# Altium footprint library ThanhNT.PcbLib: 579 footprints (part 32 of 37)
Each footprint in its own frame and in the unit in brackets; x right, y up, seen from the top. Pads: shape width x height; smd on the part's side, far side on the other; paste and mask are expansions set on the pad; w line width, h text height; cw(c..) or ccw(c..) is an arc to the next point about the centre after c.
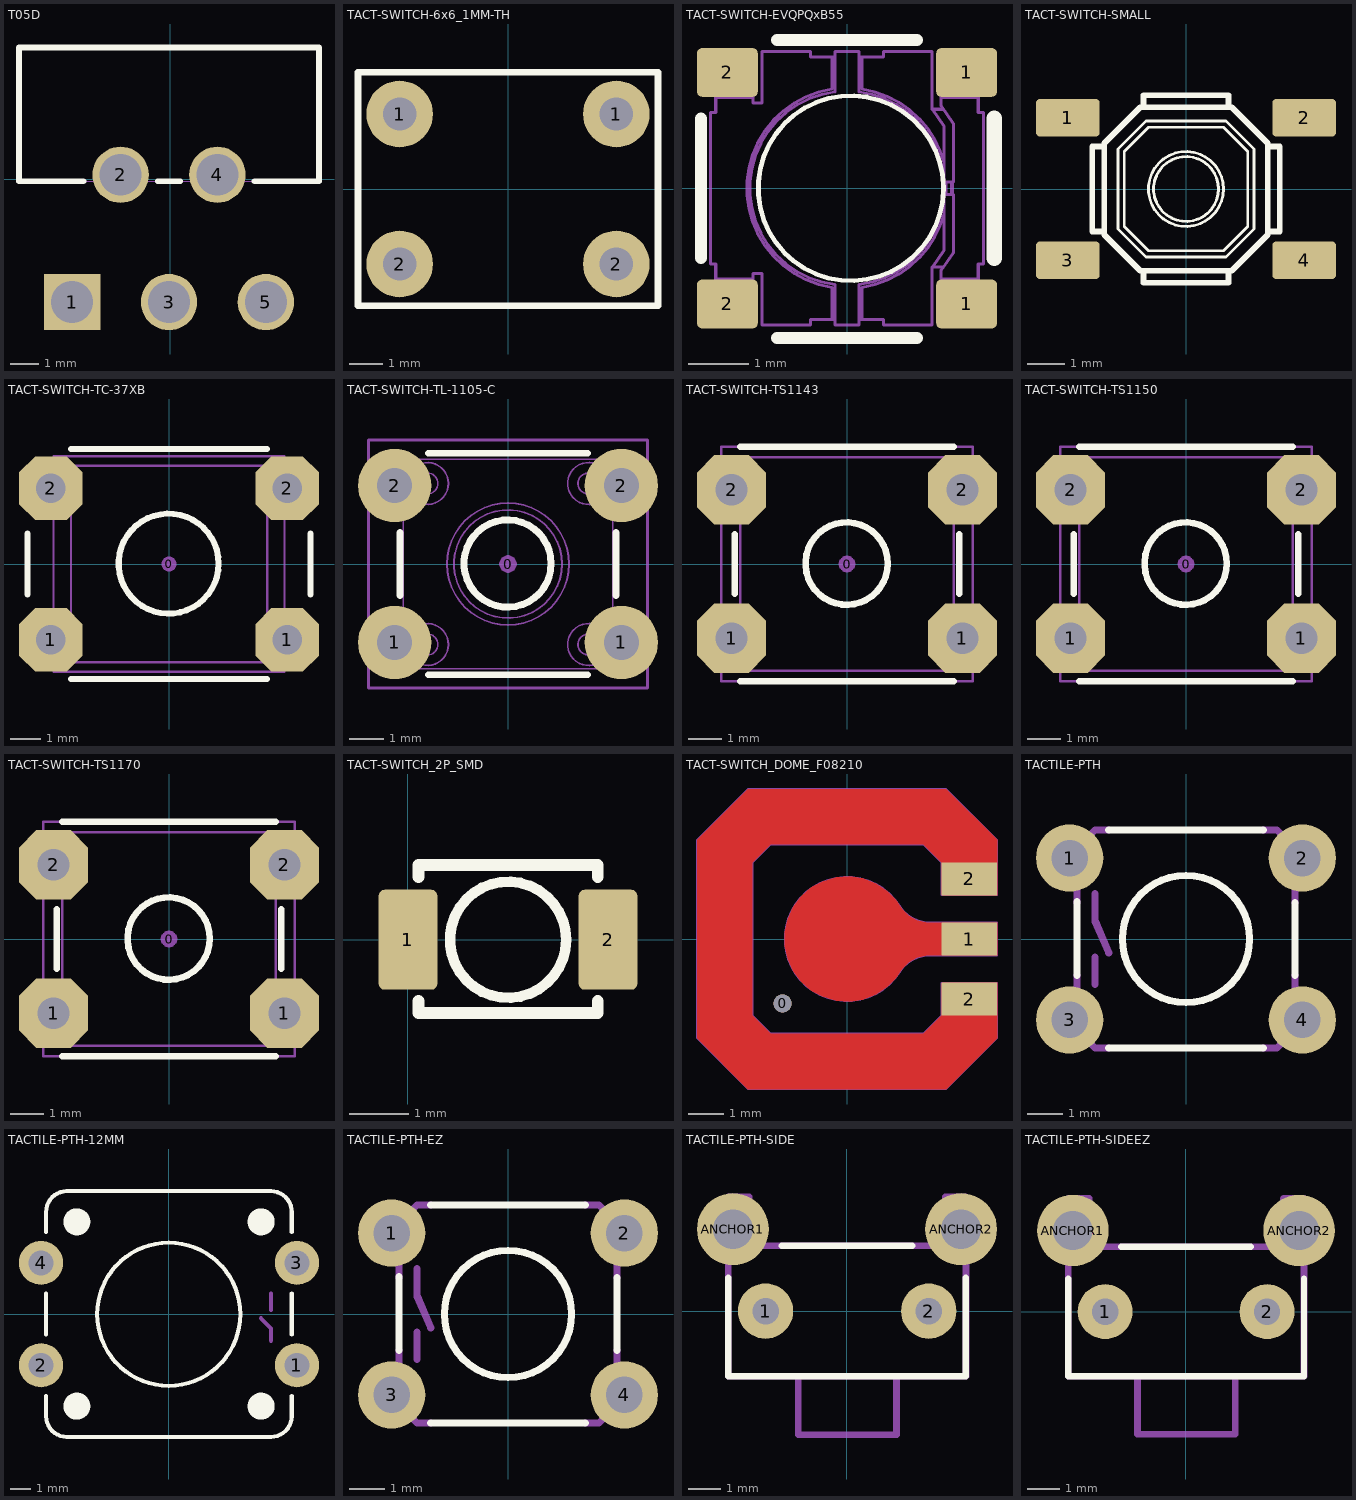
[diagram p31: the footprints below, top view; thin cyan lines are the x and y axes]

## T05D [mil]
pads (5):
  rect 78x78 hole 58 mask-1000: 1(-136,-170)
  round 78 hole 58 mask-1000: 2(-69,6) 3(-2,-170) 4(65,6) 5(132,-170)
Top Overlay:
  lines w7.87: -120.32,-3 -209.5,-3 -209.5,182 205.5,182 205.5,-3 116.32,-3 ; -17.68,-3 13.68,-3
Top Solder:
  region: -175,-209 -97,-209 -97,-131 -175,-131
  region: -69,45.34 -79.18,44 -88.67,40.07 -96.82,33.82 -103.07,25.67 -107,16.18 -108.34,6 -107,-4.18 -103.07,-13.67 -96.82,-21.82 -88.67,-28.07 -79.18,-32 -69,-33.34 -58.82,-32 -49.33,-28.07 -41.18,-21.82 -34.93,-13.67 -31,-4.18 -29.66,6 -31,16.18 -34.93,25.67 -41.18,33.82 -49.33,40.07 -58.82,44
  region: -2,-130.66 -12.18,-132 -21.67,-135.93 -29.82,-142.18 -36.07,-150.33 -40,-159.82 -41.34,-170 -40,-180.18 -36.07,-189.67 -29.82,-197.82 -21.67,-204.07 -12.18,-208 -2,-209.34 8.18,-208 17.67,-204.07 25.82,-197.82 32.07,-189.67 36,-180.18 37.34,-170 36,-159.82 32.07,-150.33 25.82,-142.18 17.67,-135.93 8.18,-132
  region: 65,45.34 54.82,44 45.33,40.07 37.18,33.82 30.93,25.67 27,16.18 25.66,6 27,-4.18 30.93,-13.67 37.18,-21.82 45.33,-28.07 54.82,-32 65,-33.34 75.18,-32 84.67,-28.07 92.82,-21.82 99.07,-13.67 103,-4.18 104.34,6 103,16.18 99.07,25.67 92.82,33.82 84.67,40.07 75.18,44
  region: 132,-130.66 121.82,-132 112.33,-135.93 104.18,-142.18 97.93,-150.33 94,-159.82 92.66,-170 94,-180.18 97.93,-189.67 104.18,-197.82 112.33,-204.07 121.82,-208 132,-209.34 142.18,-208 151.67,-204.07 159.82,-197.82 166.07,-189.67 170,-180.18 171.34,-170 170,-159.82 166.07,-150.33 159.82,-142.18 151.67,-135.93 142.18,-132
Bottom Solder:
  region: -175,-209 -97,-209 -97,-131 -175,-131
  region: -69,45.34 -79.18,44 -88.67,40.07 -96.82,33.82 -103.07,25.67 -107,16.18 -108.34,6 -107,-4.18 -103.07,-13.67 -96.82,-21.82 -88.67,-28.07 -79.18,-32 -69,-33.34 -58.82,-32 -49.33,-28.07 -41.18,-21.82 -34.93,-13.67 -31,-4.18 -29.66,6 -31,16.18 -34.93,25.67 -41.18,33.82 -49.33,40.07 -58.82,44
  region: -2,-130.66 -12.18,-132 -21.67,-135.93 -29.82,-142.18 -36.07,-150.33 -40,-159.82 -41.34,-170 -40,-180.18 -36.07,-189.67 -29.82,-197.82 -21.67,-204.07 -12.18,-208 -2,-209.34 8.18,-208 17.67,-204.07 25.82,-197.82 32.07,-189.67 36,-180.18 37.34,-170 36,-159.82 32.07,-150.33 25.82,-142.18 17.67,-135.93 8.18,-132
  region: 65,45.34 54.82,44 45.33,40.07 37.18,33.82 30.93,25.67 27,16.18 25.66,6 27,-4.18 30.93,-13.67 37.18,-21.82 45.33,-28.07 54.82,-32 65,-33.34 75.18,-32 84.67,-28.07 92.82,-21.82 99.07,-13.67 103,-4.18 104.34,6 103,16.18 99.07,25.67 92.82,33.82 84.67,40.07 75.18,44
  region: 132,-130.66 121.82,-132 112.33,-135.93 104.18,-142.18 97.93,-150.33 94,-159.82 92.66,-170 94,-180.18 97.93,-189.67 104.18,-197.82 112.33,-204.07 121.82,-208 132,-209.34 142.18,-208 151.67,-204.07 159.82,-197.82 166.07,-189.67 170,-180.18 171.34,-170 170,-159.82 166.07,-150.33 159.82,-142.18 151.67,-135.93 142.18,-132
Mechanical 1:
  lines w1: -209.5,-3 205.5,-3 205.5,182 -209.5,182 -209.5,-3

## TACT-SWITCH-6x6_1MM-TH [mm] "Tack Switch 6x6mm, 1mm button height TH"
height 5
pads (4):
  round 2 hole 1: 1(-3.25,2.25) 1(3.25,2.25) 2(-3.25,-2.25) 2(3.25,-2.25)
Top Overlay:
  lines w0.2: -4.5,-3.5 -4.5,3.5 4.5,3.5 4.5,-3.5 -4.5,-3.5
3D body "Tack Switch 6x6 1mm.STEP": height 4.41, standoff -3.49, extent -3.983,-3 3.983,3

## TACT-SWITCH-EVQPQxB55 [mm] "Panasonic SMD tact switch 4.5x4.5x0.55mm, EVQPQxB55"
height 0.55
pads (4):
  rrect20% 1x0.8 smd: 1(1.968,-1.905) 1(1.968,1.905) 2(-1.968,-1.905) 2(-1.968,1.905)
Top Overlay:
  circle w0.076: c0.064,0 r1.524
  lines w0.2: -2.4,-1.15 -2.4,1.15 ; -1.15,-2.464 1.15,-2.464 ; -1.15,2.438 1.15,2.438
  lines w0.254: 2.426,-1.15 2.426,1.15
Mechanical 13:
  lines w0.05: -2.16,-2.137 -1.55,-2.137 ; -2.16,-2.01 -1.55,-2.01 ; -2.16,-1.961 -1.55,-1.961 ; -2.16,-1.739 -1.55,-1.739 ; -2.16,-1.69 -1.55,-1.69 ; -2.16,-1.581 -1.55,-1.581 ; -2.16,-1.49 -1.55,-1.49 ; -2.16,1.49 -1.55,1.49 ; -2.16,1.581 -1.55,1.581 ; -2.16,1.69 -1.55,1.69 ; -2.16,1.739 -1.55,1.739 ; -2.16,1.961 -1.55,1.961 ; -2.16,2.01 -1.55,2.01 ; -2.16,2.137 -1.55,2.137 ; -0.25,-2.16 -0.25,-1.631 cw(c0,0) -0.25,1.631 -0.25,2.16 ; -0.2,-2.16 -0.6,-2.16 -0.6,-2.25 -1.4,-2.25 -1.4,-1.4 -1.55,-1.4 -1.55,-2.2 -2.16,-2.2 -2.16,-1.25 -2.25,-1.25 -2.25,1.25 -2.16,1.25 -2.16,2.2 -1.55,2.2 -1.55,1.4 -1.4,1.4 -1.4,2.25 -0.6,2.25 -0.6,2.16 -0.2,2.16 ; -0.2,-1.587 -0.2,-2.25 0.2,-2.25 0.2,-1.587 ; -0.2,1.587 -0.2,2.25 0.2,2.25 0.2,1.587 ; -0.198,-1.588 cw(c0,0) -0.198,1.588 ; 0.198,-1.588 ccw(c0,0) 0.198,1.588 ; 0.2,-2.16 0.6,-2.16 0.6,-2.25 1.4,-2.25 1.4,-1.303 1.6,-1.017 1.6,1.017 1.4,1.303 1.4,2.25 0.6,2.25 0.6,2.16 0.2,2.16 ; 0.25,-2.16 0.25,-1.631 ccw(c0,0) 1.6,-0.403 ; 0.25,2.16 0.25,1.631 cw(c0,0) 1.6,0.403 ; 1.402,-1.3 1.585,-1.3 ; 1.402,1.3 1.585,1.3 ; 1.55,-2.137 2.16,-2.137 ; 1.55,-2.01 2.16,-2.01 ; 1.55,-1.961 2.16,-1.961 ; 1.55,-1.739 2.16,-1.739 ; 1.55,-1.69 2.16,-1.69 ; 1.55,-1.581 2.16,-1.581 ; 1.55,-1.49 2.16,-1.49 ; 1.55,1.49 2.16,1.49 ; 1.55,1.581 2.16,1.581 ; 1.55,1.69 2.16,1.69 ; 1.55,1.739 2.16,1.739 ; 1.55,1.961 2.16,1.961 ; 1.55,2.01 2.16,2.01 ; 1.55,2.137 2.16,2.137 ; 1.628,-0.1 1.628,0.1 ; 1.722,-0.1 1.722,0.1 ; 1.738,-0.1 1.738,0.1 ; 1.55,-2.2 1.55,-1.35 1.75,-1.064 1.75,-0.1 1.612,-0.1 1.612,0.1 1.75,0.1 1.75,1.064 1.55,1.35 1.55,2.2 2.16,2.2 2.16,1.25 2.25,1.25 2.25,-1.25 2.16,-1.25 2.16,-2.2 1.55,-2.2
3D body "TACT_EVQ-PQHB55.STEP": height 0.55, standoff 0, extent -2.25,-2.25 2.25,2.25

## TACT-SWITCH-SMALL [mm]
pads (4):
  rrect20% 1.7x1 smd: 1(-3.15,1.9) 2(3.15,1.9) 3(-3.15,-1.9) 4(3.15,-1.9)
Top Overlay:
  circle w0.076: c0,0 r0.865
  circle w0.076: c0,0 r1
  lines w0.076: -1.812,-1.065 -1.065,-1.812 1.065,-1.812 1.812,-1.065 1.812,1.065 1.065,1.812 -1.065,1.812 -1.812,1.065 -1.812,-1.065 ; -1.645,-0.996 -0.996,-1.645 0.996,-1.645 1.645,-0.996 1.645,0.996 0.996,1.645 -0.996,1.645 -1.645,0.996 -1.645,-0.996
  lines w0.152: -2.181,1.134 -2.5,1.134 -2.5,-1.134 -2.182,-1.134 ; -1.134,-2.181 -1.134,-2.5 1.134,-2.5 1.134,-2.182 ; 1.134,2.181 1.134,2.5 -1.134,2.5 -1.134,2.182 ; 2.181,-1.134 2.5,-1.134 2.5,1.134 2.182,1.134 ; -2.182,-1.134 -2.182,1.218 -1.218,2.182 -1.134,2.182 ; -2.182,-1.134 -2.182,-1.218 -1.218,-2.182 1.134,-2.182 ; -1.134,2.182 1.218,2.182 2.182,1.218 2.182,1.134 ; 1.134,-2.182 1.218,-2.182 2.182,-1.218 2.182,1.134
3D body "SKQGAB.stp": height 1.51, standoff 0.01, extent -3.2,-2.6 3.2,2.6

## TACT-SWITCH-TC-37XB [mm] "Wealth Metal sealed TH tact switch"
height 5
pads (5):
  round 0.508 on Mech15: 0(0,0)
  oct 2.1x2.1 hole 0.965: 1(-3.9,-2.5) 1(3.9,-2.5) 2(-3.9,2.5) 2(3.9,2.5)
Top Overlay:
  circle w0.2: c-0.011,0.014 r1.65
  lines w0.2: -4.67,-1 -4.67,1 ; -3.239,-3.791 3.24,-3.791 ; -3.232,3.794 3.24,3.794 ; 4.67,-1 4.67,1
Mechanical 13:
  circle w0.076: c-0.011,0.014 r1.65
  lines w0.076: -3.232,-3.237 3.24,-3.237 3.24,3.24 -3.232,3.24 -3.232,-3.237
Mechanical 15:
  lines w0.076: -3.81,-3.556 -3.81,3.556 3.81,3.556 3.81,-3.556 -3.81,-3.556
3D body "TC-37XB.stp": height 5, standoff -3.9, extent -4.456,-3.6 4.456,3.6

## TACT-SWITCH-TL-1105-C [mm] "E-Switch TL1105 series tact switch 8.0mm stem height"
height 8
pads (5):
  round 0.508 on Mech15: 0(0,0)
  round 2.1 hole 1: 1(-3.25,-2.25) 1(3.25,-2.25) 2(-3.25,2.25) 2(3.25,2.25)
Top Overlay:
  circle w0.2: c-0.011,0.014 r1.25
  lines w0.2: -3.1,-0.9 -3.1,0.9 ; -2.286,-3.175 2.286,-3.175 ; -2.286,3.175 2.286,3.175 ; 3.1,-0.9 3.1,0.9
Mechanical 13:
  circle w0.05: c0,0 r1.55
  circle w0.05: c0,0 r1.75
  circle w0.05: c-2.31,2.309 r0.3
  circle w0.05: c2.307,2.309 r0.3
  circle w0.05: c-2.31,-2.308 r0.3
  circle w0.05: c2.307,-2.308 r0.3
  circle w0.05: c2.309,2.309 r0.6
  circle w0.05: c-2.309,2.309 r0.6
  circle w0.05: c2.309,-2.309 r0.6
  circle w0.05: c-2.309,-2.309 r0.6
  lines w0.05: -3.886,-2.65 -3.886,-1.85 ; -3.886,1.85 -3.886,2.65 ; -3.3,-2.65 -3.3,-1.85 ; -3.3,1.85 -3.3,2.65 ; -3.15,-2.65 -3.15,-1.85 ; -3.15,1.85 -3.15,2.65 ; -3,-2.65 -3.95,-2.65 -3.95,-1.85 -3,-1.85 ; -3,1.85 -3.95,1.85 -3.95,2.65 -3,2.65 ; -2.561,-2.853 ccw(c-2.309,-2.309) -2.538,-2.863 ; -2.561,1.764 ccw(c-2.309,2.309) -2.538,1.754 ; 2.056,-2.853 ccw(c2.309,-2.309) 2.079,-2.863 ; 2.056,1.764 ccw(c2.309,2.309) 2.079,1.754 ; 3,-2.65 3.95,-2.65 3.95,-1.85 3,-1.85 ; 3,1.85 3.95,1.85 3.95,2.65 3,2.65 ; 3.15,-2.65 3.15,-1.85 ; 3.15,1.85 3.15,2.65 ; 3.3,-2.65 3.3,-1.85 ; 3.3,1.85 3.3,2.65 ; 3.886,-2.65 3.886,-1.85 ; 3.886,1.85 3.886,2.65 ; -3,-3 -3,3 3,3 3,-3 -3,-3
Mechanical 15:
  lines w0.076: -4,-3.556 -4,3.556 4,3.556 4,-3.556 -4,-3.556
3D body "TACT_SWITCH_TL-1105-C.STEP": height 8, standoff -3.5, extent -3.95,-3 3.95,3

## TACT-SWITCH-TS1143 [mm] "Bondtact sealed TH tact switch"
height 4.318
pads (5):
  round 0.508 on Mech15: 0(0,0)
  oct 2.1x2.1 hole 0.965: 1(-3.5,-2.25) 1(3.5,-2.25) 2(-3.5,2.25) 2(3.5,2.25)
Top Overlay:
  circle w0.2: c-0.011,0.014 r1.25
  lines w0.2: -3.4,-0.9 -3.4,0.9 ; -3.239,-3.556 3.24,-3.556 ; -3.236,3.556 3.236,3.556 ; 3.4,-0.9 3.4,0.9
Mechanical 13:
  circle w0.076: c-0.011,0.014 r1.25
  lines w0.076: -3.232,-3.237 -3.232,3.24 3.24,3.24 3.24,-3.237 -3.232,-3.237
Mechanical 15:
  lines w0.076: -3.81,-3.556 3.81,-3.556 3.81,3.556 -3.81,3.556 -3.81,-3.556
3D body "TS-1143-WP.stp": height 4.3, standoff -3.5, extent -4.134,-3.25 4.134,3.25

## TACT-SWITCH-TS1150 [mm] "Bondtact sealed TH tact switch"
height 5.18
pads (5):
  round 0.508 on Mech15: 0(0,0)
  oct 2.1x2.1 hole 0.965: 1(-3.5,-2.25) 1(3.5,-2.25) 2(-3.5,2.25) 2(3.5,2.25)
Top Overlay:
  circle w0.2: c-0.011,0.014 r1.25
  lines w0.2: -3.4,-0.9 -3.4,0.9 ; -3.239,-3.556 3.24,-3.556 ; -3.236,3.556 3.236,3.556 ; 3.4,-0.9 3.4,0.9
Mechanical 13:
  circle w0.076: c-0.011,0.014 r1.25
  lines w0.076: -3.232,-3.237 3.24,-3.237 3.24,3.24 -3.232,3.24 -3.232,-3.237
Mechanical 15:
  lines w0.076: -3.81,-3.556 -3.81,3.556 3.81,3.556 3.81,-3.556 -3.81,-3.556
3D body "TS-1150-WP.stp": height 5, standoff -3.5, extent -4.134,-3.25 4.134,3.25

## TACT-SWITCH-TS1170 [mm] "Bondtact sealed TH tact switch"
height 6.985
pads (5):
  round 0.508 on Mech15: 0(0,0)
  oct 2.1x2.1 hole 0.965: 1(-3.5,-2.25) 1(3.5,-2.25) 2(-3.5,2.25) 2(3.5,2.25)
Top Overlay:
  circle w0.2: c-0.011,0.014 r1.25
  lines w0.2: -3.4,-0.9 -3.4,0.9 ; -3.239,-3.556 3.24,-3.556 ; -3.236,3.556 3.236,3.556 ; 3.4,-0.9 3.4,0.9
Mechanical 13:
  circle w0.076: c-0.011,0.014 r1.25
  lines w0.076: -3.232,-3.237 -3.232,3.24 3.24,3.24 3.24,-3.237 -3.232,-3.237
Mechanical 15:
  lines w0.076: -3.81,-3.556 3.81,-3.556 3.81,3.556 -3.81,3.556 -3.81,-3.556
3D body "TS-1170-WP.stp": height 7, standoff -3.5, extent -4.134,-3.25 4.134,3.25

## TACT-SWITCH_2P_SMD [mm] "Micro Switch SMD (B3U-1000P)"
pads (2):
  rrect20% 1x1.7 smd: 1(0,0) 2(3.4,0)
Top Overlay:
  circle w0.178: c1.702,0 r0.988
  lines w0.2: 0.178,-1.041 0.178,-1.245 3.226,-1.245 3.226,-1.041 ; 0.178,1.067 0.178,1.27 3.226,1.27 3.226,1.067
3D body "User Library-OMRON B3U1000P.STEP": height 1.61, standoff 0.01, extent -0.298,-1.25 3.702,1.25

## TACT-SWITCH_DOME_F08210 [mm] "Snaptron F08210 dome switch"
height 0.5
pads (4):
  round 0.508 hole 0.508 unplated: 0(-1.8,-1.8)
  rect 1.55x0.92 smd paste-0.8: 1(3.415,0) 2(3.415,-1.68) 2(3.415,1.68)
Top Layer:
  region: -2.77,-4.19 -4.19,-2.77 -4.19,2.77 -2.77,4.19 2.77,4.19 4.19,2.77 4.19,1.22 2.64,1.22 2.64,2.128 2.128,2.64 -2.128,2.64 -2.64,2.128 -2.64,-2.128 -2.128,-2.64 2.128,-2.64 2.64,-2.128 2.64,-1.22 4.19,-1.22 4.19,-2.77 2.77,-4.19
  region: 1.472,-0.927 1.372,-1.086 1.109,-1.354 0.795,-1.559 0.444,-1.693 0.073,-1.749 -0.302,-1.724 -0.663,-1.62 -0.993,-1.441 -1.278,-1.196 -1.503,-0.896 -1.66,-0.555 -1.74,-0.188 -1.74,0.188 -1.66,0.555 -1.503,0.896 -1.278,1.196 -0.993,1.441 -0.663,1.62 -0.302,1.724 0.073,1.749 0.444,1.693 0.795,1.559 1.109,1.354 1.372,1.086 1.472,0.927 1.546,0.825 1.729,0.652 1.949,0.531 2.193,0.468 2.319,0.46 4.19,0.46 4.19,-0.46 2.319,-0.46 2.193,-0.468 1.949,-0.531 1.729,-0.652 1.546,-0.825
Mechanical 3:
  lines w0.05: -4.19,-2.77 -4.19,2.77 -2.77,4.19 2.77,4.19 4.19,2.77 4.19,1.22 2.64,1.22 2.64,2.128 2.128,2.64 -2.128,2.64 -2.64,2.128 -2.64,-2.128 -2.128,-2.64 2.128,-2.64 2.64,-2.128 2.64,-1.22 4.19,-1.22 4.19,-2.77 2.77,-4.19 -2.77,-4.19 -4.19,-2.77 ; 1.472,-0.927 cw(c0,0) 1.472,0.927 ccw(c2.319,1.46) 2.319,0.46 4.19,0.46 4.19,-0.46 2.319,-0.46 ccw(c2.319,-1.46) 1.472,-0.927
3D body "Snap Dome F08210.STEP": height 0.48, standoff 0, extent -3.546,-3.546 3.546,3.546

## TACTILE-PTH [mil]
pads (4):
  round 74 hole 40: 1(-128,89) 2(128,89) 3(-128,-89) 4(128,-89)
Top Overlay:
  circle w7.87: c0,0 r70
  lines w7.87: -120,-40 -120,41 ; -85,-120 85,-120 ; -85,120 85,120 ; 120,-40 120,40
Mechanical 16:
  lines w8: -120,-40 -120,-100 -100,-120 -85,-120 ; -120,40 -120,100 -100,120 -85,120 ; -100,-50 -100,-20 ; -100,50 -100,20 -85,-15 ; 85,-120 100,-120 120,-100 120,-40 ; 85,120 100,120 120,100 120,40
3D body "User Library-SW-TACTILE-X6Y6H3.STEP": height 275.59, standoff -137.8, extent -155.5,-122.04 155.52,122.05

## TACTILE-PTH-12MM [mil]
pads (4):
  round 85 hole 48: 1(247,-98.43) 2(-246.06,-98.43) 3(247,99) 4(-246.06,99)
Top Overlay:
  circle w7.87: c0,0 r138
  circle w28: c-177.17,178 r12
  circle w28: c178,178 r12
  circle w28: c178,-177.17 r12
  circle w28: c-177.17,-177.17 r12
  lines w7.87: -236.22,-157.48 -236.22,-196.85 ccw(c-196.85,-196.85) -196.85,-236.22 197,-236.22 ccw(c197.31,-196.54) 237,-196.85 237,-157.48 ; -236.22,-39.37 -236.22,40 ; -236.22,158 -236.22,197 cw(c-196.54,197.31) -196.85,237 197,237 cw(c197,197) 237,197 237,158 ; 237,-39.37 237,40
Mechanical 16:
  lines w8: 178,-7.87 197,-27.56 197,-51.18 ; 197,8 197,40
3D body "43655.stp": height 169.29, standoff -137.6, extent -274.02,-235.21 276.03,237.23

## TACTILE-PTH-EZ [mil]
pads (4):
  round 74 hole 40: 1(-128,89) 2(128,89) 3(-128,-89) 4(128,-89)
Top Overlay:
  circle w7.87: c0,0 r70
  lines w7.87: -120,-40 -120,41 ; -85,-120 85,-120 ; -85,120 85,120 ; 120,-40 120,40
Top Solder:
  region: 129,-71.8 128,-71.7 124.62,-71.7 118.37,-74.29 113.59,-79.07 111,-85.32 111,-88.7 111,-89.1 111.06,-92.62 113.87,-99.08 118.93,-103.97 125.48,-106.56 129,-106.5 130,-106.6 133.34,-106.44 139.4,-103.59 143.9,-98.64 146.16,-92.34 146,-89 146,-89.2 146.04,-85.78 143.5,-79.43 138.71,-74.53 132.42,-71.84
  region: -127.6,-71.9 -128.1,-71.8 -131.47,-71.81 -137.7,-74.41 -142.45,-79.19 -145.01,-85.43 -145,-88.8 -145,-89.2 -145.04,-92.62 -142.49,-98.97 -137.71,-103.86 -131.42,-106.56 -128,-106.59 -126.8,-106.7 -123.42,-106.58 -117.26,-103.77 -112.65,-98.82 -110.28,-92.48 -110.4,-89.09 -110.4,-89.3 -110.38,-85.86 -112.98,-79.48 -117.82,-74.59 -124.16,-71.92
  region: 129,107 128,107 124.62,107 118.37,104.41 113.59,99.63 111,93.38 111,90 111,86.42 113.74,79.8 118.8,74.74 125.42,72 129,72 130,72 133.38,72.2 139.48,75.15 143.98,80.22 146.2,86.62 146,90 146,89 146.1,92.48 143.62,98.99 138.84,104.05 132.48,106.9
  region: -127.8,107 -128.3,107 -131.67,106.99 -137.9,104.39 -142.65,99.61 -145.21,93.37 -145.2,90 -145.3,86.52 -142.82,80.01 -138.03,74.95 -131.68,72.1 -128.2,72 -127,72 -123.58,72.16 -117.38,75.07 -112.76,80.13 -110.44,86.58 -110.6,90 -110.6,89 -110.52,92.5 -113.05,99.03 -117.89,104.09 -124.3,106.92
Bottom Solder:
  drawing of 4 lines, arcs and shapes, not listed
Mechanical 16:
  lines w8: -120,-40 -120,-100 -100,-120 -85,-120 ; -120,40 -120,100 -100,120 -85,120 ; -100,-50 -100,-20 ; -100,50 -100,20 -85,-15 ; 85,-120 100,-120 120,-100 120,-40 ; 85,120 100,120 120,100 120,40
3D body "User Library-PULSDTS6_L.STEP": height 374.91, standoff -127.73, extent -158.9,-123.04 152.91,121.06

## TACTILE-PTH-SIDE [mil]
pads (4):
  round 67 hole 32: 1(-98.43,0) 2(99,0)
  round 87 hole 48: ANCHOR1(-137.8,99) ANCHOR2(138,99)
Top Overlay:
  lines w7.87: -143.7,40 -143.7,-78.74 144,-78.74 144,40 ; -78.74,79 79,79
Mechanical 16:
  lines w8: -59.06,-78.74 -143.7,-78.74 -143.7,138 -118.11,138 -118.11,79 119,79 119,138 144,138 144,-78.74 60,-78.74 ; -59.06,-78.74 60,-78.74 ; -59.06,-78.74 -59.06,-149.61 60,-149.61 60,-78.74
3D body "SW3dPS-SWITCH, TACTILE, RIGHT ANGLE, 12VDC, 50MA, 3.15MM ACTUATOR, WEALTH METAL TC-0240Z.STEP": height 276.09, standoff -156.98, extent -148,-119.7 143.34,167.7

## TACTILE-PTH-SIDEEZ [mil]
pads (4):
  round 67 hole 32: 1(-98.43,0) 2(99,0)
  round 87 hole 48: ANCHOR1(-137.8,99) ANCHOR2(138,99)
Top Overlay:
  lines w7.87: -143.7,40 -143.7,-78.74 144,-78.74 144,40 ; -78.74,79 79,79
Top Solder:
  circle w0: c138,99 r25
  circle w0: c-137.8,99 r25
  circle w0: c-98.43,0 r18
  circle w0: c99,0 r18
Bottom Solder:
  circle w0: c138,99 r45
  circle w0: c-98.43,0 r35
  circle w0: c99,0 r35
  circle w0: c-137.8,99 r45
Mechanical 16:
  lines w8: -59.06,-78.74 -59.06,-149.61 60,-149.61 60,-78.74 ; -59.06,-78.74 60,-78.74 ; -59.06,-78.74 -143.7,-78.74 -143.7,138 -118.11,138 -118.11,79 119,79 119,138 144,138 144,-78.74 60,-78.74
3D body "SW3dPS-SWITCH, TACTILE, RIGHT ANGLE, 12VDC, 50MA, 3.15MM ACTUATOR, WEALTH METAL TC-0240Z.STEP": height 276.09, standoff -156.98, extent -148.67,-125.43 142.68,161.97